# Altium footprint library General.PcbLib: 128 footprints (part 5 of 8)
Each footprint in its own frame and in the unit in brackets; x right, y up, seen from the top. Pads: shape width x height; smd on the part's side, far side on the other; paste and mask are expansions set on the pad; w line width, h text height; cw(c..) or ccw(c..) is an arc to the next point about the centre after c.
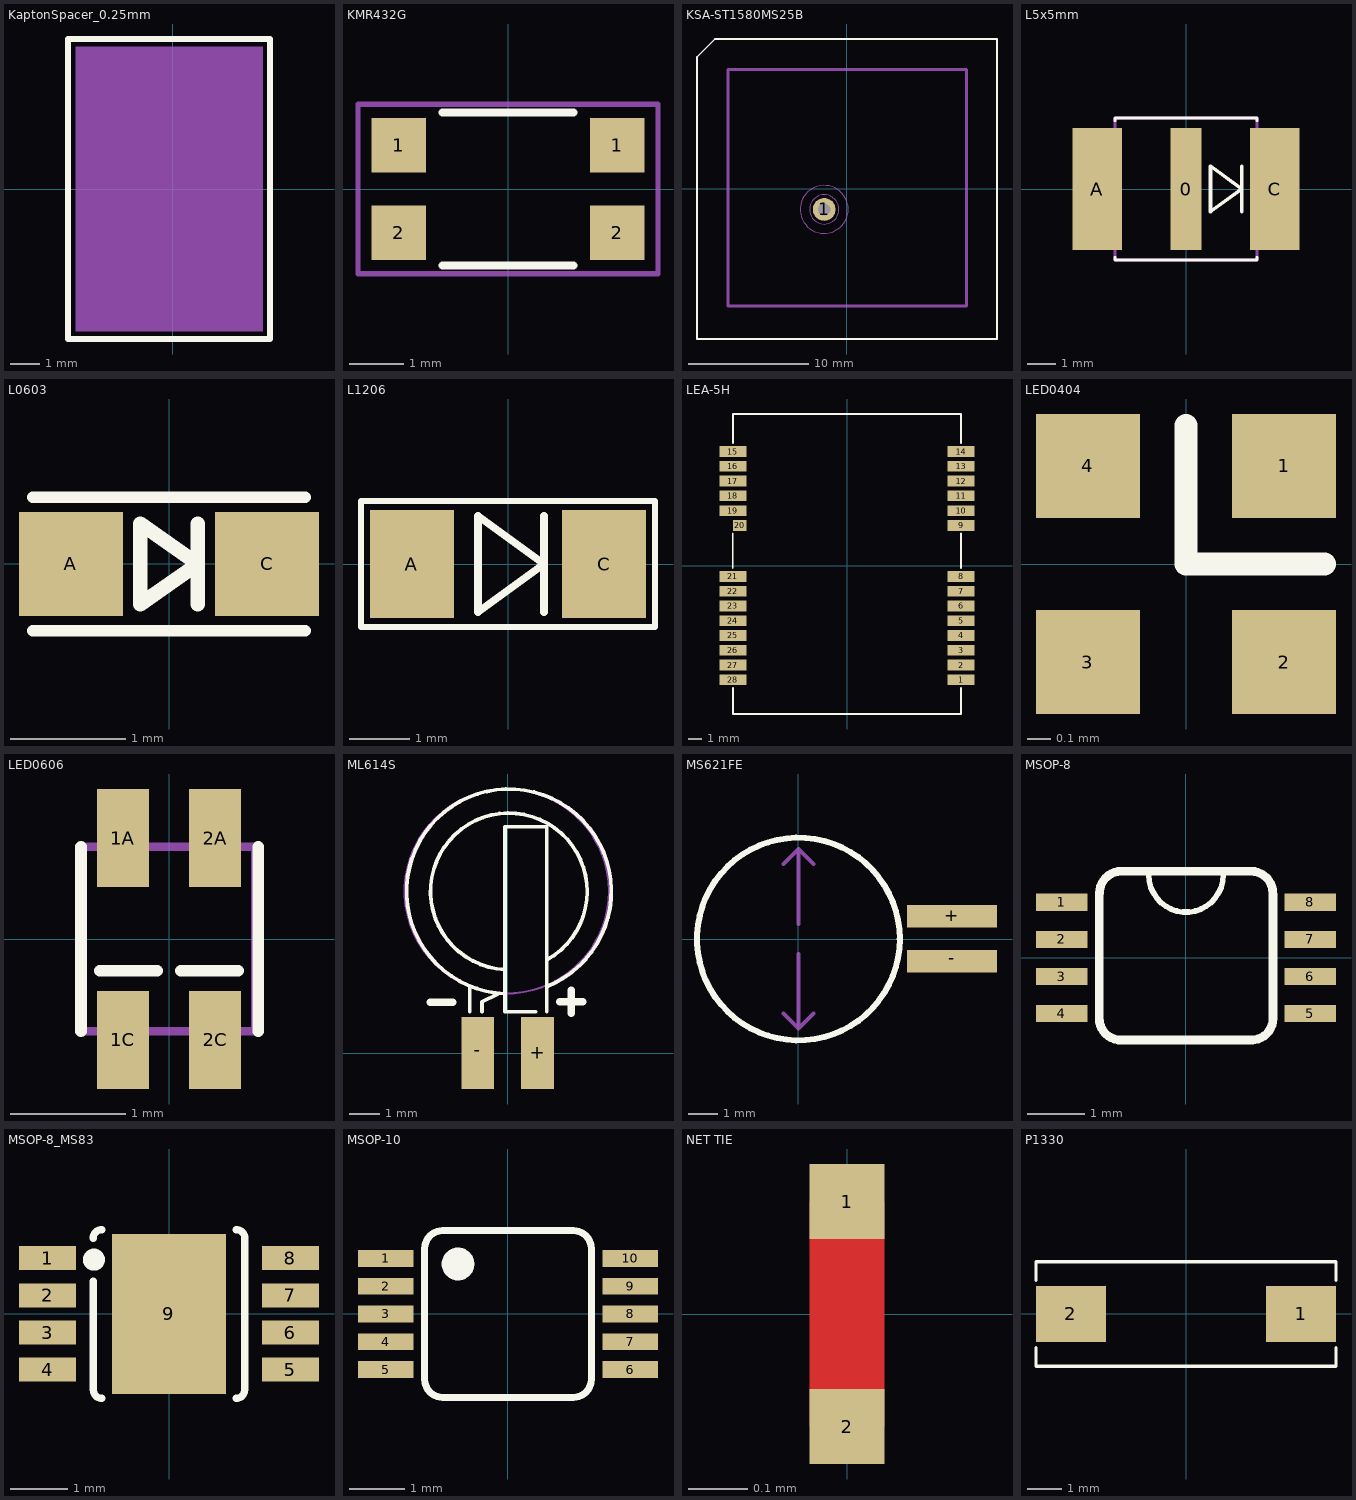
[diagram p4: the footprints below, top view; thin cyan lines are the x and y axes]

## KaptonSpacer_0.25mm [mm] "Kapton Tape 6.35 x 10.0 x 0.25 mm (3 layers of 0.08mm thick)"
height 0.25
Top Overlay:
  lines w0.203: -3.556,-5.08 -3.556,5.08 3.302,5.08 3.302,-5.08 -3.556,-5.08
Mechanical 13:
  rectangle: -3.302,-4.826 3.048,4.826
3D body: height 0.25, standoff 0, extent -3.302,-4.826 3.048,4.826

## KMR432G [mm] "SWITCH TACTILE SPST-NO 0.05A 32V"
height 2.5
pads (4):
  rect 1x1 smd: 1(-2,0.8) 1(2,0.8) 2(-2,-0.8) 2(2,-0.8)
Top Overlay:
  lines w0.15: -1.2,-1.4 1.2,-1.4 ; -1.2,1.4 1.2,1.4
Mechanical 15:
  lines w0.1: -2.75,-1.55 2.75,-1.55 2.75,1.55 -2.75,1.55 -2.75,-1.55
3D body "KMR431GLFS.stp": height 2.52, standoff -0.02, extent -2.3,-1.4 2.3,1.4

## KSA-ST1580MS25B [mm] "25mm 1580MHz 5dBi GPS patch antenna"
pads (1):
  round 1.905 hole 1.016: 1(-1.9,-1.7)
Top Overlay:
  lines w0.127: -12.5,-12.5 12.5,-12.5 12.5,12.5 -11,12.5 -12.5,11 -12.5,-12.5
Mechanical 1:
  circle w0: c-1.9,-1.7 r2
  circle w0: c-1.9,-1.7 r1.22
  lines w0.127: -12.5,-12.5 -12.5,11 -11,12.5 12.5,12.5 12.5,-12.5 -12.5,-12.5
  lines w0.254: -9.91,-9.76 9.97,-9.76 9.97,9.97 -9.91,9.97 -9.91,-9.76
3D body: height 4, standoff 0, extent -12.501,-12.501 12.501,12.501
3D body: height 4.02, standoff 0, extent -3.899,-3.699 0.099,0.299
3D body: height 4.01, standoff 0, extent -9.909,-9.759 9.969,9.969
3D body: height 5, standoff 0, extent -3.12,-2.92 -0.68,-0.48

## L5x5mm [mm] "LED 5x5 mm SMD"
pads (3):
  rect 1.1x4.3 smd: 0(0,0)
  rect 1.75x4.3 smd: A(-3.125,0) C(3.125,0)
Top Overlay:
  lines w0.1: -2.5,-2.4 -2.5,-2.5 2.5,-2.5 2.5,-2.4 ; -2.5,2.4 -2.5,2.5 2.5,2.5 2.5,2.4
  lines w0.127: 1.962,-0.795 1.962,0.805 ; 0.862,-0.795 1.962,0.005 0.862,0.805 0.862,-0.795
Mechanical 1:
  lines w0.1: -2.5,-2.5 -2.5,2.5 2.5,2.5 2.5,-2.5 -2.5,-2.5
3D body "15013.stp": height 2, standoff 0, extent -1.7,-1.753 1.75,1.697

## L0603 [mm] "LED"
pads (2):
  rect 0.9x0.9 smd: A(-0.85,0) C(0.85,0)
Top Overlay:
  lines w0.1: -1.18,-0.58 1.18,-0.58 ; -1.18,0.58 1.18,0.58
  lines w0.127: 0.25,-0.348 0.25,0 ; 0.25,0.348 0.25,0 ; 0.25,0 -0.25,-0.349 -0.25,0.349 0.25,0
3D body "SW3dPS-LED SMD0603.step": height 0.68, standoff 0, extent -0.825,-0.35 0.825,0.375

## L1206 [mm] "LED"
pads (2):
  rect 1.4x1.8 smd: A(-1.6,0) C(1.6,0)
Top Overlay:
  lines w0.1: -2.451,-1.051 -2.451,1.051 2.451,1.051 2.451,-1.051 -2.451,-1.051
  lines w0.127: 0.6,-0.8 0.6,0.8 ; -0.5,-0.8 0.6,0 -0.5,0.8 -0.5,-0.8
3D body "SW3dPS-LED1206R.STEP": height 1.11, standoff -0.4, extent -1.6,-0.8 1.6,0.8

## LEA-5H [mm] "uBlox GPS module"
pads (28):
  rect 2x0.8 smd: 1(8.5,-8.5) 2(8.5,-7.4) 3(8.5,-6.3) 4(8.5,-5.2) 5(8.5,-4.1) 6(8.5,-3) 7(8.5,-1.9) 8(8.5,-0.8) 9(8.5,3) 10(8.5,4.1) 11(8.5,5.2) 12(8.5,6.3) 13(8.5,7.4) 14(8.5,8.5) 15(-8.5,8.5) 16(-8.5,7.4) 17(-8.5,6.3) 18(-8.5,5.2) 19(-8.5,4.1) 21(-8.5,-0.8) 22(-8.5,-1.9) 23(-8.5,-3) 24(-8.5,-4.1) 25(-8.5,-5.2) 26(-8.5,-6.3) 27(-8.5,-7.4) 28(-8.5,-8.5)
  rect 1x0.8 smd: 20(-8,3)
Top Overlay:
  lines w0.127: -8.52,-0.2 -8.52,2.4 ; -8.5,-9.1 -8.5,-11.05 8.5,-11.05 8.5,-9.1 ; -8.5,9.12 -8.5,11.3 8.5,11.3 8.5,9.14 ; 8.5,-0.18 8.5,2.4
3D body "SW3dPS-ublox gps module.step": height 3, standoff 0, extent -8.5,-11.05 8.5,11.35

## LED0404 [mm] "Multi-color 1mm x 1mm LED"
height 0.3
pads (4):
  rect 0.45x0.45 smd: 1(0.425,0.425) 2(0.425,-0.425) 3(-0.425,-0.425) 4(-0.425,0.425)
Top Overlay:
  lines w0.1: 0,0.6 0,0 0.6,0
3D body "SMLP34.STEP": height 0.19, standoff -0.02, extent -0.5,-0.5 0.5,0.5

## LED0606 [mm]
pads (4):
  rect 0.45x0.85 smd: 1A(-0.4,0.875) 1C(-0.4,-0.875) 2A(0.4,0.875) 2C(0.4,-0.875)
Top Overlay:
  lines w0.1: -0.763,-0.8 -0.763,0.8 ; -0.6,-0.275 -0.1,-0.275 ; 0.1,-0.275 0.6,-0.275 ; 0.775,-0.8 0.775,0.8
Mechanical 13:
  lines w0.076: -0.75,-0.8 -0.75,0.8 0.75,0.8 0.75,-0.8 -0.75,-0.8
3D body: height 0.7, standoff 0, extent -0.749,-0.449 0.749,0.449
3D body: height 0.3, standoff 0, extent -0.749,-0.799 0.749,0.799

## ML614S [mm] "3.3V Coin Cell Battery"
pads (2):
  rect 1.1x2.4 smd: +(1,0) -(-1,0)
Top Overlay:
  lines w0.127: -1.265,1.38 -1.265,2.232 ; -0.86,1.382 -0.86,1.71 -0.346,1.967 ; -0.1,2.786 cw(c0.038,5.396) 1.305,3.11 ; -0.09,1.981 cw(c0.041,5.396) 1.305,2.221 ; 0.924,1.38 -0.092,1.38 -0.092,2.856 -0.092,7.555 1.305,7.555 ; 1.305,1.38 1.305,7.553
  lines w0.254: -2.577,1.693 -1.831,1.693 ; 1.743,1.713 2.505,1.713 ; 2.124,1.332 2.124,2.094
Mechanical 13:
  circle w0.076: c-0.03,5.4 r3.41
3D body: height 1.45, standoff 0, extent -3.439,1.991 3.379,8.809

## MS621FE [mil] "MS621FE"
pads (2):
  rect 119x30 smd: +(203,30) -(203,-29.53)
Top Overlay:
  circle w8: c0,0 r134
Mechanical 16:
  region: 256,-19.68 170,-19.68 170,-39.37 256,-39.37
  region: 256,20 256,40 170,40 170,20
  lines w5: -19.68,-98.43 0,-118.11 ; -19.68,99 0,119 ; 0,-19.68 0,-118.11 ; 0,20 0,119 ; 20,-98.43 0,-118.11 ; 20,99 0,119
  text "6.8MM" at -47.24,-11.81 h37.2
3D body: height 100.39, standoff 0, extent -133.44,-134.23 135.02,134.23

## MSOP-8 [mm]
pads (8):
  rect 0.9x0.3 smd: 1(-2.175,0.975) 2(-2.175,0.325) 3(-2.175,-0.325) 4(-2.175,-0.975) 5(2.175,-0.975) 6(2.175,-0.325) 7(2.175,0.325) 8(2.175,0.975)
Top Overlay:
  lines w0.1: -0.65,1.45 ccw(c0,1.45) 0.65,1.45
  lines w0.152: -1.519,1.116 -1.519,-1.056 ccw(c-1.138,-1.056) -1.138,-1.437 ; -1.514,1.136 cw(c-1.133,1.136) -1.133,1.517 ; -1.188,-1.437 1.168,-1.437 ; -1.183,1.517 1.163,1.517 ; 1.138,1.517 cw(c1.138,1.136) 1.519,1.136 ; 1.143,-1.437 ccw(c1.143,-1.056) 1.524,-1.056 1.524,1.116
3D body "SW3dPS-MSOP8.step": height 1.07, standoff -0.03, extent -2.469,-1.55 2.469,1.55

## MSOP-8_MS83 [mm]
pads (9):
  rect 1x0.42 smd: 1(-2.125,0.975) 2(-2.125,0.325) 3(-2.125,-0.325) 4(-2.125,-0.975) 5(2.125,-0.975) 6(2.125,-0.325) 7(2.125,0.325) 8(2.125,0.975)
  rect 2x2.8 smd paste-0.35: 9(0,0)
Top Overlay:
  circle w0.305: c-1.315,0.95 r0.04
  lines w0.127: -1.327,1.323 cw(c-1.175,1.323) -1.175,1.475 ; -1.325,0.575 -1.325,-1.325 ccw(c-1.173,-1.325) -1.173,-1.477 ; 1.173,-1.477 ccw(c1.173,-1.325) 1.325,-1.325 1.325,1.325 ; 1.175,1.475 cw(c1.175,1.323) 1.327,1.323
3D body "User Library-MSOP8.step": height 1.09, standoff -0.01, extent -2.469,-1.55 2.469,1.55

## MSOP-10 [mm]
pads (10):
  rect 1x0.3 smd: 1(-2.2,1) 2(-2.2,0.5) 3(-2.2,0) 4(-2.2,-0.5) 5(-2.2,-1) 6(2.2,-1) 7(2.2,-0.5) 8(2.2,0) 9(2.2,0.5) 10(2.2,1)
Top Overlay:
  circle w0.305: c-0.9,0.9 r0.141
  lines w0.127: -1.5,-1.183 ccw(c-1.182,-1.183) -1.182,-1.5 1.183,-1.5 ccw(c1.183,-1.183) 1.5,-1.183 1.5,1.182 ccw(c1.183,1.182) 1.183,1.5 -1.182,1.5 ccw(c-1.182,1.182) -1.5,1.182 -1.5,-1.183
3D body "User Library-MSOP10.step": height 1.08, standoff -0.02, extent -2.45,-1.5 2.45,1.5

## NET TIE [mil] "Net Tie"
pads (2):
  rect 5x5 smd: 1(0,7.5) 2(0,-7.5)
Top Layer:
  rectangle: -2.5,-7.5 2.5,7.5

## P1330 [mm]
pads (2):
  rect 2x1.6 smd: 1(3.3,0) 2(-3.3,0)
Top Overlay:
  lines w0.1: -4.3,-0.965 -4.3,-1.5 4.3,-1.5 4.3,-0.965 ; -4.3,0.965 -4.3,1.5 4.3,1.5 4.3,0.965
3D body: height 3.7, standoff 0, extent -4.35,-1.55 4.35,1.55